# Altium schematic symbol library Analog Devices Data Converters Digital-to-Analog Converters.SchLib: 2231 symbols (part 133 of 135)
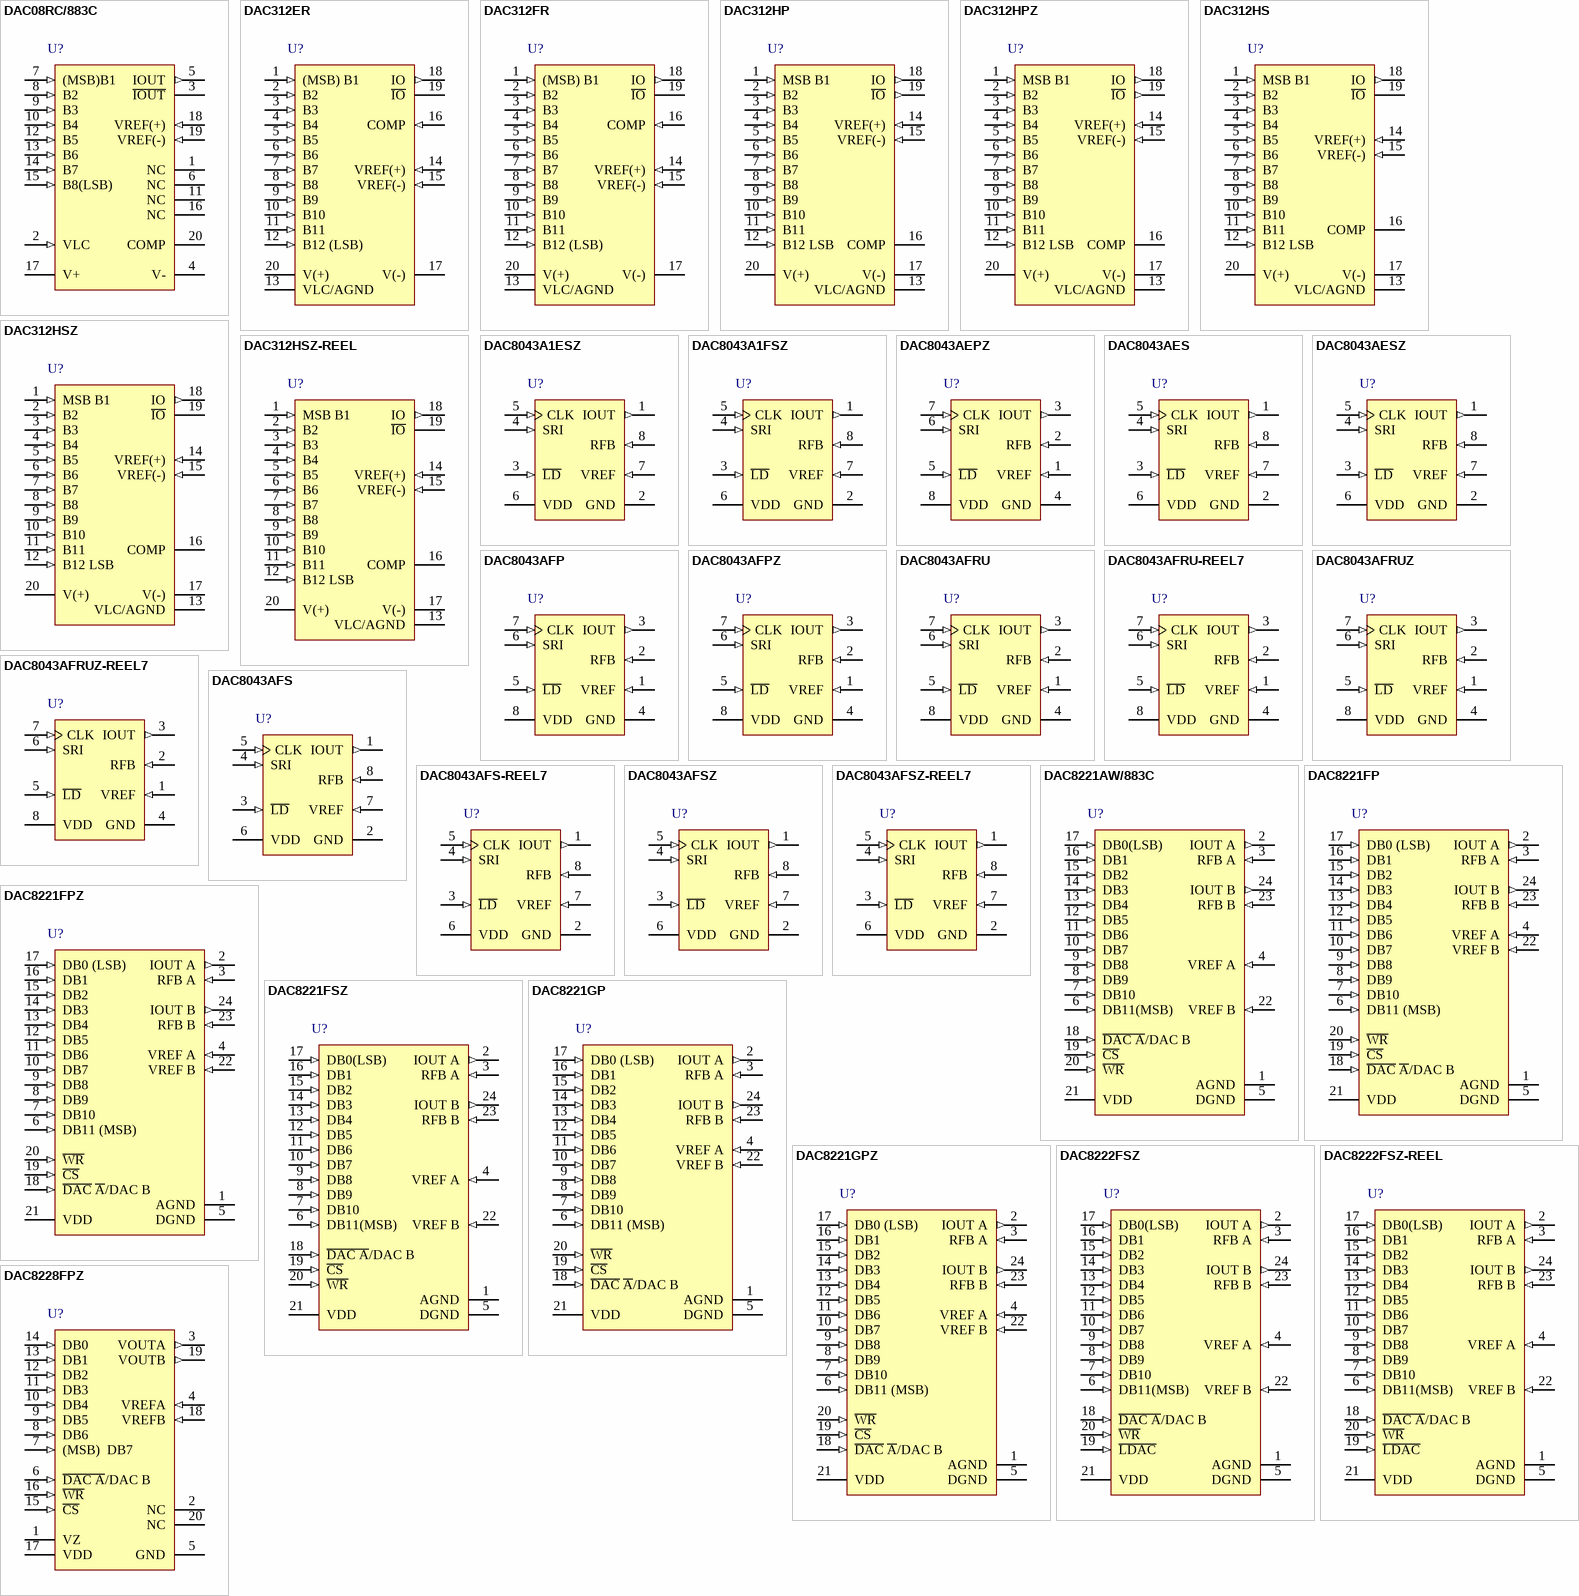
[diagram p245: symbols DAC08RC/883C to DAC8228FPZ]

## DAC8043AFS
designator U?
Single 12-Bit Multiplying Digital-to-Analog Converter with Serial Interface, -40 to +85 degC, R-8, Tube; Generic Part Number: DAC8043A; Manufacturer: Analog Devices; PartNumber: DAC8043AFS; # DAC Outputs: 1; Max V+: 5.5V; Op Pwr Diss: 50µW; Resolution (Bits): 12; Settling Time: 250ns; Single Supply: Yes; DatasheetVersion: Rev.B; PackageVersion: 060506-A; PackageReference: R-8; PackageDescription: 8-Lead Standard Small Outline Package [SOIC_N] Narrow Body; Supplier 1: Digi-Key; Supplier Part Number 1: DAC8043AFS-ND; Supplier 2: Mouser; Supplier Part Number 2: 584-DAC8043AFS; Packing: Tube; RoHS: N; Mounting Technology: Surface Mount; Code_JEDEC: MS-012-AA; Code_IPC: SOIC127P600-8; ComponentLink1Description: Manufacturer URL; ComponentLink1URL: http://www.analog.com/en/index.html; ComponentLink2Description: Datasheet; ComponentLink2URL: http://www.analog.com/static/imported-files/data_sheets/DAC8043A.pdf; ComponentLink3Description: Package Specification; ComponentLink3URL: http://www.analog.com/static/imported-files/packages/PKG_PDF/SOIC_Narrow%20(R)/R_8.pdf; ComponentLink4Description: Product URL; ComponentLink4URL: http://www.analog.com/en/digital-to-analog-converters/da-converters/dac8043a/products/product.html
footprint R-8_N (SOIC, 8-Leads, Body 4.9x3.9mm, Pitch 1.27mm, IPC Medium Density)
footprint R-8_L (SOIC, 8-Leads, Body 4.9x3.9mm, Pitch 1.27mm, IPC High Density)
footprint R-8_M (SOIC, 8-Leads, Body 4.9x3.9mm, Pitch 1.27mm, IPC Low Density)
pins: 1 IOUT (out) "DAC Current Output, full-scale output 1 LSB less than reference input voltage -VREF.", 2 GND (power) "Analog and Digital Ground.", 3 ~{LD} (in) "Load Strobe, Level-Sensitive Digital Input.Transfers shift-register data to DAC register while active low. See truth table for operation.", 4 SRI (in) "12-Bit Serial Register Input, data loads directly into the shift register MSB first. Extra leading bits are ignored.", 5 CLK (in) "Clock Input, positive-edge clocks data into shift register.", 6 VDD (power) "Positive Power Supply Input. Specified range of operation 5V +/- 10%.", 7 VREF (in) "DAC Reference Input Pin. Establishes DAC fullscale voltage. Constant input resistance versus code.", 8 RFB (in) "Internal Matching Feedback Resistor. Connect to external op amp output."

## DAC8043AFS-REEL7
designator U?
Single 12-Bit Multiplying Digital-to-Analog Converter with Serial Interface, -40 to +85 degC, R-8, Reel; Generic Part Number: DAC8043A; Manufacturer: Analog Devices; PartNumber: DAC8043AFS-REEL7; # DAC Outputs: 1; Max V+: 5.5V; Op Pwr Diss: 50µW; Resolution (Bits): 12; Settling Time: 250ns; Single Supply: Yes; DatasheetVersion: Rev.B; PackageVersion: 060506-A; PackageReference: R-8; PackageDescription: 8-Lead Standard Small Outline Package [SOIC_N] Narrow Body; Supplier 1: Digi-Key; Supplier Part Number 1: DAC8043AFS-REEL7-ND; Supplier 2: Mouser; Supplier Part Number 2: 584-DAC8043AFS-R7; Packing: Reel; RoHS: N; Mounting Technology: Surface Mount; Code_JEDEC: MS-012-AA; Code_IPC: SOIC127P600-8; ComponentLink1Description: Manufacturer URL; ComponentLink1URL: http://www.analog.com/en/index.html; ComponentLink2Description: Datasheet; ComponentLink2URL: http://www.analog.com/static/imported-files/data_sheets/DAC8043A.pdf; ComponentLink3Description: Package Specification; ComponentLink3URL: http://www.analog.com/static/imported-files/packages/PKG_PDF/SOIC_Narrow%20(R)/R_8.pdf; ComponentLink4Description: Product URL; ComponentLink4URL: http://www.analog.com/en/digital-to-analog-converters/da-converters/dac8043a/products/product.html
footprint R-8_N (SOIC, 8-Leads, Body 4.9x3.9mm, Pitch 1.27mm, IPC Medium Density)
footprint R-8_L (SOIC, 8-Leads, Body 4.9x3.9mm, Pitch 1.27mm, IPC High Density)
footprint R-8_M (SOIC, 8-Leads, Body 4.9x3.9mm, Pitch 1.27mm, IPC Low Density)
pins: 1 IOUT (out) "DAC Current Output, full-scale output 1 LSB less than reference input voltage -VREF.", 2 GND (power) "Analog and Digital Ground.", 3 ~{LD} (in) "Load Strobe, Level-Sensitive Digital Input.Transfers shift-register data to DAC register while active low. See truth table for operation.", 4 SRI (in) "12-Bit Serial Register Input, data loads directly into the shift register MSB first. Extra leading bits are ignored.", 5 CLK (in) "Clock Input, positive-edge clocks data into shift register.", 6 VDD (power) "Positive Power Supply Input. Specified range of operation 5V +/- 10%.", 7 VREF (in) "DAC Reference Input Pin. Establishes DAC fullscale voltage. Constant input resistance versus code.", 8 RFB (in) "Internal Matching Feedback Resistor. Connect to external op amp output."

## DAC8043AFSZ
designator U?
Single 12-Bit Multiplying Digital-to-Analog Converter with Serial Interface, -40 to +85 degC, R-8, Pb-Free, Tube; Generic Part Number: DAC8043A; Manufacturer: Analog Devices; PartNumber: DAC8043AFSZ; # DAC Outputs: 1; Max V+: 5.5V; Op Pwr Diss: 50µW; Resolution (Bits): 12; Settling Time: 250ns; Single Supply: Yes; DatasheetVersion: Rev.B; PackageVersion: 060506-A; PackageReference: R-8; PackageDescription: 8-Lead Standard Small Outline Package [SOIC_N] Narrow Body; Supplier 1: Digi-Key; Supplier Part Number 1: DAC8043AFSZ-ND; Supplier 2: Newark; Supplier Part Number 2: 59K7916; Supplier 3: Mouser; Supplier Part Number 3: 584-DAC8043AFSZ; Packing: Tube; RoHS: Y; Mounting Technology: Surface Mount; Code_JEDEC: MS-012-AA; Code_IPC: SOIC127P600-8; ComponentLink1Description: Manufacturer URL; ComponentLink1URL: http://www.analog.com/en/index.html; ComponentLink2Description: Datasheet; ComponentLink2URL: http://www.analog.com/static/imported-files/data_sheets/DAC8043A.pdf; ComponentLink3Description: Package Specification; ComponentLink3URL: http://www.analog.com/static/imported-files/packages/PKG_PDF/SOIC_Narrow%20(R)/R_8.pdf; ComponentLink4Description: Product URL; ComponentLink4URL: http://www.analog.com/en/digital-to-analog-converters/da-converters/dac8043a/products/product.html
footprint R-8_N (SOIC, 8-Leads, Body 4.9x3.9mm, Pitch 1.27mm, IPC Medium Density)
footprint R-8_L (SOIC, 8-Leads, Body 4.9x3.9mm, Pitch 1.27mm, IPC High Density)
footprint R-8_M (SOIC, 8-Leads, Body 4.9x3.9mm, Pitch 1.27mm, IPC Low Density)
pins: 1 IOUT (out) "DAC Current Output, full-scale output 1 LSB less than reference input voltage -VREF.", 2 GND (power) "Analog and Digital Ground.", 3 ~{LD} (in) "Load Strobe, Level-Sensitive Digital Input.Transfers shift-register data to DAC register while active low. See truth table for operation.", 4 SRI (in) "12-Bit Serial Register Input, data loads directly into the shift register MSB first. Extra leading bits are ignored.", 5 CLK (in) "Clock Input, positive-edge clocks data into shift register.", 6 VDD (power) "Positive Power Supply Input. Specified range of operation 5V +/- 10%.", 7 VREF (in) "DAC Reference Input Pin. Establishes DAC fullscale voltage. Constant input resistance versus code.", 8 RFB (in) "Internal Matching Feedback Resistor. Connect to external op amp output."

## DAC8043AFSZ-REEL7
designator U?
Single 12-Bit Multiplying Digital-to-Analog Converter with Serial Interface, -40 to +85 degC, R-8, Pb-Free, Reel; Generic Part Number: DAC8043A; Manufacturer: Analog Devices; PartNumber: DAC8043AFSZ-REEL7; # DAC Outputs: 1; Max V+: 5.5V; Op Pwr Diss: 50µW; Resolution (Bits): 12; Settling Time: 250ns; Single Supply: Yes; DatasheetVersion: Rev.B; PackageVersion: 060506-A; PackageReference: R-8; PackageDescription: 8-Lead Standard Small Outline Package [SOIC_N] Narrow Body; Supplier 1: Digi-Key; Supplier Part Number 1: DAC8043AFSZ-REEL7-ND; Supplier 2: Newark; Supplier Part Number 2: 59K7917; Supplier 3: Mouser; Supplier Part Number 3: 584-DAC8043AFSZR7; Packing: Reel; RoHS: Y; Mounting Technology: Surface Mount; Code_JEDEC: MS-012-AA; Code_IPC: SOIC127P600-8; ComponentLink1Description: Manufacturer URL; ComponentLink1URL: http://www.analog.com/en/index.html; ComponentLink2Description: Datasheet; ComponentLink2URL: http://www.analog.com/static/imported-files/data_sheets/DAC8043A.pdf; ComponentLink3Description: Package Specification; ComponentLink3URL: http://www.analog.com/static/imported-files/packages/PKG_PDF/SOIC_Narrow%20(R)/R_8.pdf; ComponentLink4Description: Product URL; ComponentLink4URL: http://www.analog.com/en/digital-to-analog-converters/da-converters/dac8043a/products/product.html
footprint R-8_N (SOIC, 8-Leads, Body 4.9x3.9mm, Pitch 1.27mm, IPC Medium Density)
footprint R-8_L (SOIC, 8-Leads, Body 4.9x3.9mm, Pitch 1.27mm, IPC High Density)
footprint R-8_M (SOIC, 8-Leads, Body 4.9x3.9mm, Pitch 1.27mm, IPC Low Density)
pins: 1 IOUT (out) "DAC Current Output, full-scale output 1 LSB less than reference input voltage -VREF.", 2 GND (power) "Analog and Digital Ground.", 3 ~{LD} (in) "Load Strobe, Level-Sensitive Digital Input.Transfers shift-register data to DAC register while active low. See truth table for operation.", 4 SRI (in) "12-Bit Serial Register Input, data loads directly into the shift register MSB first. Extra leading bits are ignored.", 5 CLK (in) "Clock Input, positive-edge clocks data into shift register.", 6 VDD (power) "Positive Power Supply Input. Specified range of operation 5V +/- 10%.", 7 VREF (in) "DAC Reference Input Pin. Establishes DAC fullscale voltage. Constant input resistance versus code.", 8 RFB (in) "Internal Matching Feedback Resistor. Connect to external op amp output."

## DAC8221AW/883C
designator U?
Dual 12-Bit CMOS Buffered Multiplying Digital-to-Analog Converter, -55 to +125 degC, Q-24-1, Tube; Generic Part Number: DAC8221; Manufacturer: Analog Devices; PartNumber: DAC8221AW/883C; # DAC Outputs: 2; Max V+: 15.75V; Op Pwr Diss: 5mW; Resolution (Bits): 12; Settling Time: 450ns; Single Supply: Yes; DatasheetVersion: Rev.B; PackageVersion: 100808-A; PackageReference: Q-24-1; PackageDescription: 24-Lead Ceramic Dual In-Line Package [CERDIP]; Supplier 1: Mouser; Supplier Part Number 1: 584-DAC8221AW883C; Packing: Tube; RoHS: N; Mounting Technology: Through Hole; ComponentLink1Description: Manufacturer URL; ComponentLink1URL: http://www.analog.com/en/index.html; ComponentLink2Description: Datasheet; ComponentLink2URL: http://www.analog.com/static/imported-files/data_sheets/DAC8221.pdf; ComponentLink3Description: Package Specification; ComponentLink3URL: http://www.analog.com/static/imported-files/packages/PKG_PDF/CERDIP(Q)/Q_24_1.pdf; ComponentLink4Description: Product URL; ComponentLink4URL: http://www.analog.com/en/digital-to-analog-converters/da-converters/dac8221/products/product.html
footprint Q-24-1 (DIP, 24-Leads, Row Spacing 7.62mm, Pitch 2.54mm, Body 31.9x6.7mm)
pins: 1 AGND (power), 2 IOUT A (out), 3 RFB A (in), 4 VREF A (in), 5 DGND (power), 6 DB11(MSB)  (in), 7 DB10 (in), 8 DB9 (in), 9 DB8 (in), 10 DB7 (in), 11 DB6 (in), 12 DB5 (in), 13 DB4 (in), 14 DB3 (in), 15 DB2 (in), 16 DB1 (in), 17 DB0(LSB) (in), 18 ~{DAC A}/DAC B (in), 19 ~{CS} (in), 20 ~{WR} (in), 21 VDD (power), 22 VREF B (in), 23 RFB B (in), 24 IOUT B (out)

## DAC8221FP
designator U?
Dual 12-Bit CMOS Buffered Multiplying Digital-to-Analog Converter, -40 to +85 degC, N-24-1, Tube; Generic Part Number: DAC8221; Manufacturer: Analog Devices; PartNumber: DAC8221FP; # DAC Outputs: 2; Max V+: 15.75V; Op Pwr Diss: 5mW; Resolution (Bits): 12; Settling Time: 450ns; Single Supply: Yes; DatasheetVersion: Rev.B; PackageVersion: 071006-A; PackageReference: N-24-1; PackageDescription: 24-Lead Plastic Dual In-Line Package [PDIP] Narrow Body; Supplier 1: Digi-Key; Supplier Part Number 1: DAC8221FP-ND; Supplier 2: Mouser; Supplier Part Number 2: 584-DAC8221FP; Packing: Tube; RoHS: N; Mounting Technology: Through Hole; Code_JEDEC: MS-001; ComponentLink1Description: Manufacturer URL; ComponentLink1URL: http://www.analog.com/en/index.html; ComponentLink2Description: Datasheet; ComponentLink2URL: http://www.analog.com/static/imported-files/data_sheets/DAC8221.pdf; ComponentLink3Description: Package Specification; ComponentLink3URL: http://www.analog.com/static/imported-files/packages/50726455539629N_24_1.pdf; ComponentLink4Description: Product URL; ComponentLink4URL: http://www.analog.com/en/digital-to-analog-converters/da-converters/dac8221/products/product.html
footprint N-24-1 (DIP, 24-Leads, Row Spacing 7.62mm, Pitch 2.54mm, Body 31.9x6.6mm)
pins: 1 AGND (power), 2 IOUT A (out), 3 RFB A (in), 4 VREF A (in), 5 DGND (power), 6 DB11 (MSB) (in), 7 DB10 (in), 8 DB9 (in), 9 DB8 (in), 10 DB7 (in), 11 DB6 (in), 12 DB5 (in), 13 DB4 (in), 14 DB3 (in), 15 DB2 (in), 16 DB1 (in), 17 DB0 (LSB) (in), 18 ~{DAC} ~{A}/DAC B (in), 19 ~{CS} (in), 20 ~{WR} (in), 21 VDD (power), 22 VREF B (in), 23 RFB B (in), 24 IOUT B (out)

## DAC8221FPZ
designator U?
Dual 12-Bit CMOS Buffered Multiplying Digital-to-Analog Converter, -40 to +85 degC, N-24-1, Pb-Free, Tube; Generic Part Number: DAC8221; Manufacturer: Analog Devices; PartNumber: DAC8221FPZ; # DAC Outputs: 2; Max V+: 15.75V; Op Pwr Diss: 5mW; Resolution (Bits): 12; Settling Time: 450ns; Single Supply: Yes; DatasheetVersion: Rev.B; PackageVersion: 071006-A; PackageReference: N-24-1; PackageDescription: 24-Lead Plastic Dual In-Line Package [PDIP] Narrow Body; Supplier 1: Digi-Key; Supplier Part Number 1: DAC8221FPZ-ND; Supplier 2: Mouser; Supplier Part Number 2: 584-DAC8221FPZ; Packing: Tube; RoHS: Y; Mounting Technology: Through Hole; Code_JEDEC: MS-001; ComponentLink1Description: Manufacturer URL; ComponentLink1URL: http://www.analog.com/en/index.html; ComponentLink2Description: Datasheet; ComponentLink2URL: http://www.analog.com/static/imported-files/data_sheets/DAC8221.pdf; ComponentLink3Description: Package Specification; ComponentLink3URL: http://www.analog.com/static/imported-files/packages/50726455539629N_24_1.pdf; ComponentLink4Description: Product URL; ComponentLink4URL: http://www.analog.com/en/digital-to-analog-converters/da-converters/dac8221/products/product.html
footprint N-24-1 (DIP, 24-Leads, Row Spacing 7.62mm, Pitch 2.54mm, Body 31.9x6.6mm)
pins: 1 AGND (power), 2 IOUT A (out), 3 RFB A (in), 4 VREF A (in), 5 DGND (power), 6 DB11 (MSB) (in), 7 DB10 (in), 8 DB9 (in), 9 DB8 (in), 10 DB7 (in), 11 DB6 (in), 12 DB5 (in), 13 DB4 (in), 14 DB3 (in), 15 DB2 (in), 16 DB1 (in), 17 DB0 (LSB) (in), 18 ~{DAC} ~{A}/DAC B (in), 19 ~{CS} (in), 20 ~{WR} (in), 21 VDD (power), 22 VREF B (in), 23 RFB B (in), 24 IOUT B (out)

## DAC8221FSZ
designator U?
Dual 12-Bit CMOS Buffered Multiplying Digital-to-Analog Converter, -40 to +85 degC, RW-24, Pb-Free, Tube; Generic Part Number: DAC8221; Manufacturer: Analog Devices; PartNumber: DAC8221FSZ; # DAC Outputs: 2; Max V+: 15.75V; Op Pwr Diss: 5mW; Resolution (Bits): 12; Settling Time: 450ns; Single Supply: Yes; DatasheetVersion: Rev.B; PackageVersion: 060706-A; PackageReference: RW-24; PackageDescription: 24-Lead Standard Small Outline Package [SOIC_W]; Supplier 1: Digi-Key; Supplier Part Number 1: DAC8221FSZ-ND; Supplier 2: Mouser; Supplier Part Number 2: 584-DAC8221FSZ; Packing: Tube; RoHS: Y; Mounting Technology: Surface Mount; Code_JEDEC: MS-013-AD; ComponentLink1Description: Manufacturer URL; ComponentLink1URL: http://www.analog.com/en/index.html; ComponentLink2Description: Datasheet; ComponentLink2URL: http://www.analog.com/static/imported-files/data_sheets/DAC8221.pdf; ComponentLink3Description: Package Specification; ComponentLink3URL: http://www.analog.com/static/imported-files/packages/33665150946139RW_24.pdf; ComponentLink4Description: Product URL; ComponentLink4URL: http://www.analog.com/en/digital-to-analog-converters/da-converters/dac8221/products/product.html
footprint RW-24_N (SOIC, 24-Leads, Body 15.4x7.5mm, Pitch 1.27mm, IPC Medium Density)
footprint RW-24_L (SOIC, 24-Leads, Body 15.4x7.5mm, Pitch 1.27mm, IPC High Density)
footprint RW-24_M (SOIC, 24-Leads, Body 15.4x7.5mm, Pitch 1.27mm, IPC Low Density)
pins: 1 AGND (power), 2 IOUT A (out), 3 RFB A (in), 4 VREF A (in), 5 DGND (power), 6 DB11(MSB) (in), 7 DB10 (in), 8 DB9 (in), 9 DB8 (in), 10 DB7 (in), 11 DB6 (in), 12 DB5 (in), 13 DB4 (in), 14 DB3 (in), 15 DB2 (in), 16 DB1 (in), 17 DB0(LSB) (in), 18 ~{DAC A}/DAC B (in), 19 ~{CS} (in), 20 ~{WR} (in), 21 VDD (power), 22 VREF B (in), 23 RFB B (in), 24 IOUT B (out)

## DAC8221GP
designator U?
Dual 12-Bit CMOS Buffered Multiplying Digital-to-Analog Converter, 0 to +70 degC, N-24-1, Tube; Generic Part Number: DAC8221; Manufacturer: Analog Devices; PartNumber: DAC8221GP; # DAC Outputs: 2; Max V+: 15.75V; Op Pwr Diss: 5mW; Resolution (Bits): 12; Settling Time: 450ns; Single Supply: Yes; DatasheetVersion: Rev.B; PackageVersion: 071006-A; PackageReference: N-24-1; PackageDescription: 24-Lead Plastic Dual In-Line Package [PDIP] Narrow Body; Supplier 1: Digi-Key; Supplier Part Number 1: DAC8221GP-ND; Supplier 2: Mouser; Supplier Part Number 2: 584-DAC8221GP; Packing: Tube; RoHS: N; Mounting Technology: Through Hole; Code_JEDEC: MS-001; ComponentLink1Description: Manufacturer URL; ComponentLink1URL: http://www.analog.com/en/index.html; ComponentLink2Description: Datasheet; ComponentLink2URL: http://www.analog.com/static/imported-files/data_sheets/DAC8221.pdf; ComponentLink3Description: Package Specification; ComponentLink3URL: http://www.analog.com/static/imported-files/packages/50726455539629N_24_1.pdf; ComponentLink4Description: Product URL; ComponentLink4URL: http://www.analog.com/en/digital-to-analog-converters/da-converters/dac8221/products/product.html
footprint N-24-1 (DIP, 24-Leads, Row Spacing 7.62mm, Pitch 2.54mm, Body 31.9x6.6mm)
pins: 1 AGND (power), 2 IOUT A (out), 3 RFB A (in), 4 VREF A (in), 5 DGND (power), 6 DB11 (MSB) (in), 7 DB10 (in), 8 DB9 (in), 9 DB8 (in), 10 DB7 (in), 11 DB6 (in), 12 DB5 (in), 13 DB4 (in), 14 DB3 (in), 15 DB2 (in), 16 DB1 (in), 17 DB0 (LSB) (in), 18 ~{DAC} ~{A}/DAC B (in), 19 ~{CS} (in), 20 ~{WR} (in), 21 VDD (power), 22 VREF B (in), 23 RFB B (in), 24 IOUT B (out)

## DAC8221GPZ
designator U?
Dual 12-Bit CMOS Buffered Multiplying Digital-to-Analog Converter, 0 to +70 degC, N-24-1, Pb-Free, Tube; Generic Part Number: DAC8221; Manufacturer: Analog Devices; PartNumber: DAC8221GPZ; # DAC Outputs: 2; Max V+: 15.75V; Op Pwr Diss: 5mW; Resolution (Bits): 12; Settling Time: 450ns; Single Supply: Yes; DatasheetVersion: Rev.B; PackageVersion: 071006-A; PackageReference: N-24-1; PackageDescription: 24-Lead Plastic Dual In-Line Package [PDIP] Narrow Body; Supplier 1: Digi-Key; Supplier Part Number 1: DAC8221GPZ-ND; Supplier 2: Mouser; Supplier Part Number 2: 584-DAC8221GPZ; Packing: Tube; RoHS: Y; Mounting Technology: Through Hole; Code_JEDEC: MS-001; ComponentLink1Description: Manufacturer URL; ComponentLink1URL: http://www.analog.com/en/index.html; ComponentLink2Description: Datasheet; ComponentLink2URL: http://www.analog.com/static/imported-files/data_sheets/DAC8221.pdf; ComponentLink3Description: Package Specification; ComponentLink3URL: http://www.analog.com/static/imported-files/packages/50726455539629N_24_1.pdf; ComponentLink4Description: Product URL; ComponentLink4URL: http://www.analog.com/en/digital-to-analog-converters/da-converters/dac8221/products/product.html
footprint N-24-1 (DIP, 24-Leads, Row Spacing 7.62mm, Pitch 2.54mm, Body 31.9x6.6mm)
pins: 1 AGND (power), 2 IOUT A (out), 3 RFB A (in), 4 VREF A (in), 5 DGND (power), 6 DB11 (MSB) (in), 7 DB10 (in), 8 DB9 (in), 9 DB8 (in), 10 DB7 (in), 11 DB6 (in), 12 DB5 (in), 13 DB4 (in), 14 DB3 (in), 15 DB2 (in), 16 DB1 (in), 17 DB0 (LSB) (in), 18 ~{DAC} ~{A}/DAC B (in), 19 ~{CS} (in), 20 ~{WR} (in), 21 VDD (power), 22 VREF B (in), 23 RFB B (in), 24 IOUT B (out)

## DAC8222FSZ
designator U?
Dual 12-Bit CMOS Buffered Multiplying Digital-to-Analog Converter, -40 to +85 degC, RW-24, Pb-Free, Tube; Generic Part Number: DAC8222; Manufacturer: Analog Devices; PartNumber: DAC8222FSZ; # DAC Outputs: 2; Max V+: 15.75V; Op Pwr Diss: 50µW; Resolution (Bits): 12; Settling Time: 1µs; Single Supply: Yes; DatasheetVersion: Rev.C; PackageVersion: 060706-A; PackageReference: RW-24; PackageDescription: 24-Lead Standard Small Outline Package [SOIC_W]; Supplier 1: Digi-Key; Supplier Part Number 1: DAC8222FSZ-ND; Supplier 2: Farnell; Supplier Part Number 2: 1438738; Supplier 3: Newark; Supplier Part Number 3: 59K7927; Supplier 4: Mouser; Supplier Part Number 4: 584-DAC8222FSZ; Packing: Tube; RoHS: Y; Mounting Technology: Surface Mount; Code_JEDEC: MS-013-AD; ComponentLink1Description: Manufacturer URL; ComponentLink1URL: http://www.analog.com/en/index.html; ComponentLink2Description: Datasheet; ComponentLink2URL: http://www.analog.com/static/imported-files/data_sheets/DAC8222.pdf; ComponentLink3Description: Package Specification; ComponentLink3URL: http://www.analog.com/static/imported-files/packages/33665150946139RW_24.pdf; ComponentLink4Description: Product URL; ComponentLink4URL: http://www.analog.com/en/digital-to-analog-converters/da-converters/dac8222/products/product.html
footprint RW-24_N (SOIC, 24-Leads, Body 15.4x7.5mm, Pitch 1.27mm, IPC Medium Density)
footprint RW-24_L (SOIC, 24-Leads, Body 15.4x7.5mm, Pitch 1.27mm, IPC High Density)
footprint RW-24_M (SOIC, 24-Leads, Body 15.4x7.5mm, Pitch 1.27mm, IPC Low Density)
pins: 1 AGND (power), 2 IOUT A (out), 3 RFB A (in), 4 VREF A (in), 5 DGND (power), 6 DB11(MSB) (in), 7 DB10 (in), 8 DB9 (in), 9 DB8 (in), 10 DB7 (in), 11 DB6 (in), 12 DB5 (in), 13 DB4 (in), 14 DB3 (in), 15 DB2 (in), 16 DB1 (in), 17 DB0(LSB) (in), 18 ~{DAC A}/DAC B (in), 19 ~{LDAC} (in), 20 ~{WR} (in), 21 VDD (power), 22 VREF B (in), 23 RFB B (in), 24 IOUT B (out)

## DAC8222FSZ-REEL
designator U?
Dual 12-Bit CMOS Buffered Multiplying Digital-to-Analog Converter, 0 to +70 degC, RW-24, Pb-Free, Reel; Generic Part Number: DAC8222; Manufacturer: Analog Devices; PartNumber: DAC8222FSZ-REEL; # DAC Outputs: 2; Max V+: 15.75V; Op Pwr Diss: 50µW; Resolution (Bits): 12; Settling Time: 1µs; Single Supply: Yes; DatasheetVersion: Rev.C; PackageVersion: 060706-A; PackageReference: RW-24; PackageDescription: 24-Lead Standard Small Outline Package [SOIC_W]; Supplier 1: Digi-Key; Supplier Part Number 1: DAC8222FSZ-REEL-ND; Supplier 2: Newark; Supplier Part Number 2: 52R8312; Supplier 3: Mouser; Supplier Part Number 3: 584-DAC8222FSZ-R; Packing: Reel; RoHS: Y; Mounting Technology: Surface Mount; Code_JEDEC: MS-013-AD; ComponentLink1Description: Manufacturer URL; ComponentLink1URL: http://www.analog.com/en/index.html; ComponentLink2Description: Datasheet; ComponentLink2URL: http://www.analog.com/static/imported-files/data_sheets/DAC8222.pdf; ComponentLink3Description: Package Specification; ComponentLink3URL: http://www.analog.com/static/imported-files/packages/33665150946139RW_24.pdf; ComponentLink4Description: Product URL; ComponentLink4URL: http://www.analog.com/en/digital-to-analog-converters/da-converters/dac8222/products/product.html
footprint RW-24_N (SOIC, 24-Leads, Body 15.4x7.5mm, Pitch 1.27mm, IPC Medium Density)
footprint RW-24_L (SOIC, 24-Leads, Body 15.4x7.5mm, Pitch 1.27mm, IPC High Density)
footprint RW-24_M (SOIC, 24-Leads, Body 15.4x7.5mm, Pitch 1.27mm, IPC Low Density)
pins: 1 AGND (power), 2 IOUT A (out), 3 RFB A (in), 4 VREF A (in), 5 DGND (power), 6 DB11(MSB) (in), 7 DB10 (in), 8 DB9 (in), 9 DB8 (in), 10 DB7 (in), 11 DB6 (in), 12 DB5 (in), 13 DB4 (in), 14 DB3 (in), 15 DB2 (in), 16 DB1 (in), 17 DB0(LSB) (in), 18 ~{DAC A}/DAC B (in), 19 ~{LDAC} (in), 20 ~{WR} (in), 21 VDD (power), 22 VREF B (in), 23 RFB B (in), 24 IOUT B (out)

## DAC8228FPZ
designator U?
Dual 8-Bit CMOS Voltage Output Digital-to-Analog Converter, -40 to +85 degC, N-20, Pb-Free, Tube; Generic Part Number: DAC8228; Manufacturer: Analog Devices; PartNumber: DAC8228FPZ; # DAC Outputs: 2; Max V+: 15.75V; Op Pwr Diss: 84mW; Resolution (Bits): 8; Settling Time: 2µs; Single Supply: Yes; DatasheetVersion: Rev.A; PackageVersion: 070706-A; PackageReference: N-20; PackageDescription: 20-Lead Plastic Dual In-Line Package [PDIP] Narrow Body; Supplier 1: Digi-Key; Supplier Part Number 1: DAC8228FPZ-ND; Supplier 2: Farnell; Supplier Part Number 2: 1079367; Supplier 3: Newark; Supplier Part Number 3: 31M4868; Supplier 4: Mouser; Supplier Part Number 4: 584-DAC8228FPZ; Packing: Tube; RoHS: Y; Mounting Technology: Through Hole; Code_JEDEC: MS-001; ComponentLink1Description: Manufacturer URL; ComponentLink1URL: http://www.analog.com/en/index.html; ComponentLink2Description: Datasheet; ComponentLink2URL: http://www.analog.com/static/imported-files/data_sheets/DAC8228.pdf; ComponentLink3Description: Package Specification; ComponentLink3URL: http://www.analog.com/static/imported-files/packages/50601349676519N_20.pdf; ComponentLink4Description: Product URL; ComponentLink4URL: http://www.analog.com/en/digital-to-analog-converters/da-converters/dac8228/products/product.html
footprint N-20 (DIP, 20-Leads, Row Spacing 7.62mm, Pitch 2.54mm, Body 25.9x6.6mm)
pins: 1 VZ (power), 2 NC, 3 VOUTA (out), 4 VREFA (in), 5 GND (power), 6 ~{DAC A}/DAC B (in), 7 (MSB)  DB7 (in), 8 DB6 (in), 9 DB5 (in), 10 DB4 (in), 11 DB3 (in), 12 DB2 (in), 13 DB1 (in), 14 DB0 (in), 15 ~{CS} (in), 16 ~{WR} (in), 17 VDD (power), 18 VREFB (in), 19 VOUTB (out), 20 NC

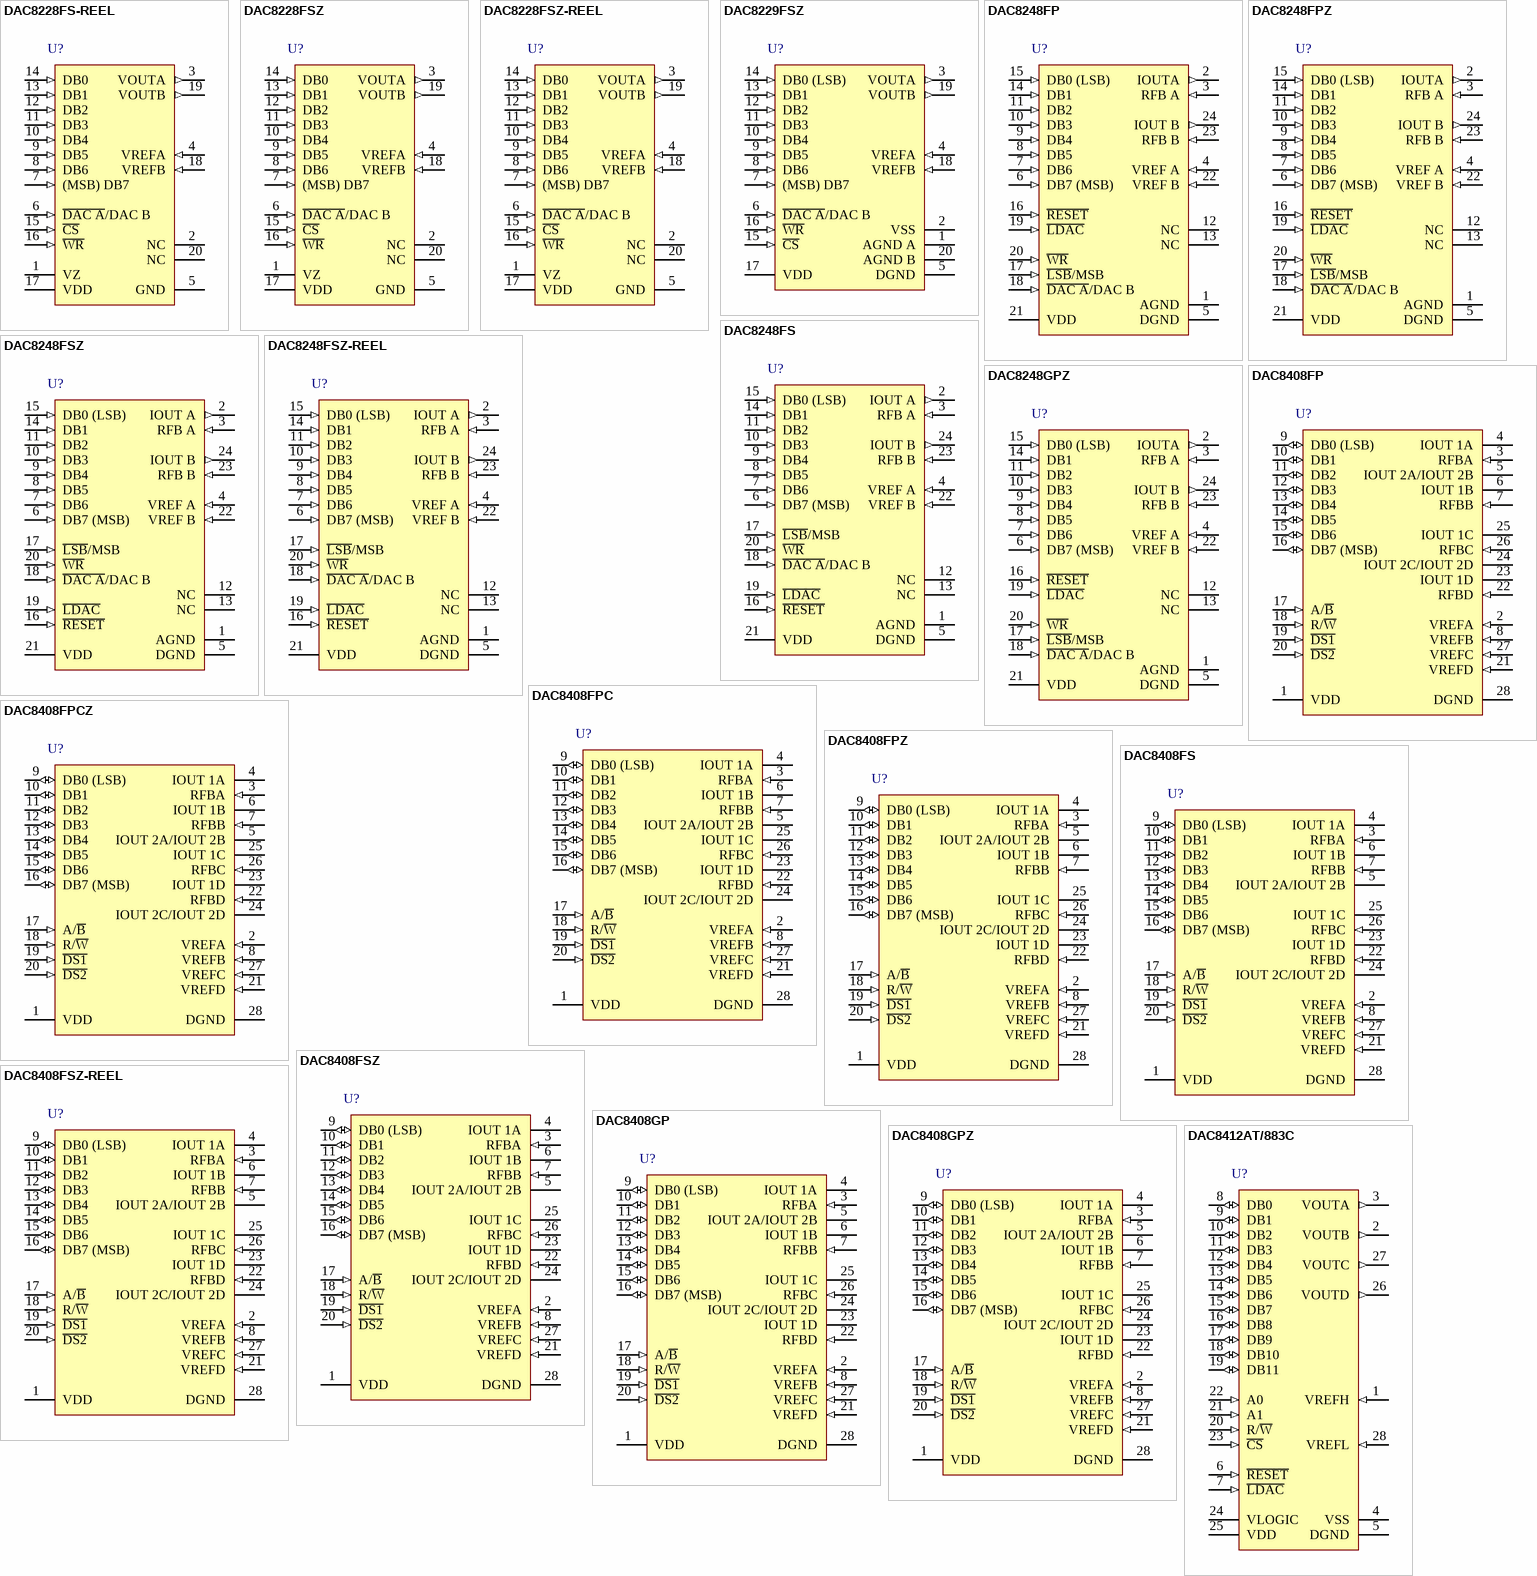
[diagram p111: symbols DAC8228FS-REEL to DAC8412AT/883C]

## DAC8228FS-REEL
designator U?
Dual 8-Bit CMOS Voltage Output Digital-to-Analog Converter, 0 to +70 degC, RW-20, Reel; Generic Part Number: DAC8228; Manufacturer: Analog Devices; PartNumber: DAC8228FS-REEL; # DAC Outputs: 2; Max V+: 15.75V; Op Pwr Diss: 84mW; Resolution (Bits): 8; Settling Time: 2µs; Single Supply: Yes; DatasheetVersion: Rev.A; PackageVersion: 060706-A; PackageReference: RW-20; PackageDescription: 20-Lead Standard Small Outline Package [SOIC_W] Wide Body; Supplier 1: Digi-Key; Supplier Part Number 1: DAC8228FS-REELTR-ND; Supplier 2: Digi-Key; Supplier Part Number 2: DAC8228FS-REELCT-ND; Supplier 3: Digi-Key; Supplier Part Number 3: DAC8228FS-REELDKR-ND; Supplier 4: Mouser; Supplier Part Number 4: 584-DAC8228FS-R; Packing: Reel; RoHS: N; Mounting Technology: Surface Mount; Code_JEDEC: MS-013-AC; ComponentLink1Description: Manufacturer URL; ComponentLink1URL: http://www.analog.com/en/index.html; ComponentLink2Description: Datasheet; ComponentLink2URL: http://www.analog.com/static/imported-files/data_sheets/DAC8228.pdf; ComponentLink3Description: Package Specification; ComponentLink3URL: http://www.analog.com/static/imported-files/packages/233848RW_20.pdf; ComponentLink4Description: Product URL; ComponentLink4URL: http://www.analog.com/en/digital-to-analog-converters/da-converters/dac8228/products/product.html
footprint RW-20_N (SOIC, 20-Leads, Body 12.8x7.5mm, Pitch 1.27mm, IPC Medium Density)
footprint RW-20_L (SOIC, 20-Leads, Body 12.8x7.5mm, Pitch 1.27mm, IPC High Density)
footprint RW-20_M (SOIC, 20-Leads, Body 12.8x7.5mm, Pitch 1.27mm, IPC Low Density)
pins: 1 VZ (power), 2 NC, 3 VOUTA (out), 4 VREFA (in), 5 GND (power), 6 ~{DAC A}/DAC B (in), 7 (MSB) DB7 (in), 8 DB6 (in), 9 DB5 (in), 10 DB4 (in), 11 DB3 (in), 12 DB2 (in), 13 DB1 (in), 14 DB0 (in), 15 ~{CS} (in), 16 ~{WR} (in), 17 VDD (power), 18 VREFB (in), 19 VOUTB (out), 20 NC

## DAC8228FSZ
designator U?
Dual 8-Bit CMOS Voltage Output Digital-to-Analog Converter, -40 to +85 degC, RW-20, Pb-Free, Tube; Generic Part Number: DAC8228; Manufacturer: Analog Devices; PartNumber: DAC8228FSZ; # DAC Outputs: 2; Max V+: 15.75V; Op Pwr Diss: 84mW; Resolution (Bits): 8; Settling Time: 2µs; Single Supply: Yes; DatasheetVersion: Rev.A; PackageVersion: 060706-A; PackageReference: RW-20; PackageDescription: 20-Lead Standard Small Outline Package [SOIC_W] Wide Body; Supplier 1: Digi-Key; Supplier Part Number 1: DAC8228FSZ-ND; Supplier 2: Mouser; Supplier Part Number 2: 584-DAC8228FSZ; Packing: Tube; RoHS: Y; Mounting Technology: Surface Mount; Code_JEDEC: MS-013-AC; ComponentLink1Description: Manufacturer URL; ComponentLink1URL: http://www.analog.com/en/index.html; ComponentLink2Description: Datasheet; ComponentLink2URL: http://www.analog.com/static/imported-files/data_sheets/DAC8228.pdf; ComponentLink3Description: Package Specification; ComponentLink3URL: http://www.analog.com/static/imported-files/packages/233848RW_20.pdf; ComponentLink4Description: Product URL; ComponentLink4URL: http://www.analog.com/en/digital-to-analog-converters/da-converters/dac8228/products/product.html
footprint RW-20_N (SOIC, 20-Leads, Body 12.8x7.5mm, Pitch 1.27mm, IPC Medium Density)
footprint RW-20_L (SOIC, 20-Leads, Body 12.8x7.5mm, Pitch 1.27mm, IPC High Density)
footprint RW-20_M (SOIC, 20-Leads, Body 12.8x7.5mm, Pitch 1.27mm, IPC Low Density)
pins: 1 VZ (power), 2 NC, 3 VOUTA (out), 4 VREFA (in), 5 GND (power), 6 ~{DAC A}/DAC B (in), 7 (MSB) DB7 (in), 8 DB6 (in), 9 DB5 (in), 10 DB4 (in), 11 DB3 (in), 12 DB2 (in), 13 DB1 (in), 14 DB0 (in), 15 ~{CS} (in), 16 ~{WR} (in), 17 VDD (power), 18 VREFB (in), 19 VOUTB (out), 20 NC

## DAC8228FSZ-REEL
designator U?
Dual 8-Bit CMOS Voltage Output Digital-to-Analog Converter, 0 to +70 degC, RW-20, Pb-Free, Reel; Generic Part Number: DAC8228; Manufacturer: Analog Devices; PartNumber: DAC8228FSZ-REEL; # DAC Outputs: 2; Max V+: 15.75V; Op Pwr Diss: 84mW; Resolution (Bits): 8; Settling Time: 2µs; Single Supply: Yes; DatasheetVersion: Rev.A; PackageVersion: 060706-A; PackageReference: RW-20; PackageDescription: 20-Lead Standard Small Outline Package [SOIC_W] Wide Body; Supplier 1: Digi-Key; Supplier Part Number 1: DAC8228FSZ-REEL-ND; Supplier 2: Mouser; Supplier Part Number 2: 584-DAC8228FSZ-R; Packing: Reel; RoHS: Y; Mounting Technology: Surface Mount; Code_JEDEC: MS-013-AC; ComponentLink1Description: Manufacturer URL; ComponentLink1URL: http://www.analog.com/en/index.html; ComponentLink2Description: Datasheet; ComponentLink2URL: http://www.analog.com/static/imported-files/data_sheets/DAC8228.pdf; ComponentLink3Description: Package Specification; ComponentLink3URL: http://www.analog.com/static/imported-files/packages/233848RW_20.pdf; ComponentLink4Description: Product URL; ComponentLink4URL: http://www.analog.com/en/digital-to-analog-converters/da-converters/dac8228/products/product.html
footprint RW-20_N (SOIC, 20-Leads, Body 12.8x7.5mm, Pitch 1.27mm, IPC Medium Density)
footprint RW-20_L (SOIC, 20-Leads, Body 12.8x7.5mm, Pitch 1.27mm, IPC High Density)
footprint RW-20_M (SOIC, 20-Leads, Body 12.8x7.5mm, Pitch 1.27mm, IPC Low Density)
pins: 1 VZ (power), 2 NC, 3 VOUTA (out), 4 VREFA (in), 5 GND (power), 6 ~{DAC A}/DAC B (in), 7 (MSB) DB7 (in), 8 DB6 (in), 9 DB5 (in), 10 DB4 (in), 11 DB3 (in), 12 DB2 (in), 13 DB1 (in), 14 DB0 (in), 15 ~{CS} (in), 16 ~{WR} (in), 17 VDD (power), 18 VREFB (in), 19 VOUTB (out), 20 NC

## DAC8229FSZ
designator U?
Dual 8-Bit CMOS Voltage Output Digital-to-Analog Converter, -40 to +85 degC, RW-20, Pb-Free, Tube; Generic Part Number: DAC8229; Manufacturer: Analog Devices; PartNumber: DAC8229FSZ; # DAC Outputs: 2; Max V+: 15.75V; Op Pwr Diss: 97mW; Resolution (Bits): 8; Settling Time: 2µs; Single Supply: No; DatasheetVersion: Rev.A; PackageVersion: 060706-A; PackageReference: RW-20; PackageDescription: 20-Lead Standard Small Outline Package [SOIC_W] Wide Body; Supplier 1: Digi-Key; Supplier Part Number 1: DAC8229FSZ-ND; Supplier 2: Farnell; Supplier Part Number 2: 2312727; Supplier 3: Newark; Supplier Part Number 3: 12M9665; Supplier 4: Mouser; Supplier Part Number 4: 584-DAC8229FSZ; Packing: Tube; RoHS: Y; Mounting Technology: Surface Mount; Code_JEDEC: MS-013-AC; ComponentLink1Description: Manufacturer URL; ComponentLink1URL: http://www.analog.com/en/index.html; ComponentLink2Description: Datasheet; ComponentLink2URL: http://www.analog.com/static/imported-files/data_sheets/DAC8229.pdf; ComponentLink3Description: Package Specification; ComponentLink3URL: http://www.analog.com/static/imported-files/packages/233848RW_20.pdf; ComponentLink4Description: Product URL; ComponentLink4URL: http://www.analog.com/en/digital-to-analog-converters/da-converters/dac8229/products/product.html
footprint RW-20_N (SOIC, 20-Leads, Body 12.8x7.5mm, Pitch 1.27mm, IPC Medium Density)
footprint RW-20_L (SOIC, 20-Leads, Body 12.8x7.5mm, Pitch 1.27mm, IPC High Density)
footprint RW-20_M (SOIC, 20-Leads, Body 12.8x7.5mm, Pitch 1.27mm, IPC Low Density)
pins: 1 AGND A (power), 2 VSS (power), 3 VOUTA (out), 4 VREFA (in), 5 DGND (power), 6 ~{DAC A}/DAC B (in), 7 (MSB) DB7 (in), 8 DB6 (in), 9 DB5 (in), 10 DB4 (in), 11 DB3 (in), 12 DB2 (in), 13 DB1 (in), 14 DB0 (LSB) (in), 15 ~{CS} (in), 16 ~{WR} (in), 17 VDD (power), 18 VREFB (in), 19 VOUTB (out), 20 AGND B (power)

## DAC8248FP
designator U?
Dual 12-Bit (8-Bit Byte) CMOS Double-Buffered Digital-to-Analog Converter, -40 to +85 degC, N-24-1, Tube; Generic Part Number: DAC8248; Manufacturer: Analog Devices; PartNumber: DAC8248FP; # DAC Outputs: 2; Max V+: 15.75V; Op Pwr Diss: 30mW; Resolution (Bits): 12; Settling Time: 1µs; Single Supply: Yes; DatasheetVersion: Rev.B; PackageVersion: 071006-A; PackageReference: N-24-1; PackageDescription: 24-Lead Plastic Dual In-Line Package [PDIP] Narrow Body; Supplier 1: Digi-Key; Supplier Part Number 1: DAC8248FP-ND; Supplier 2: Mouser; Supplier Part Number 2: 584-DAC8248FP; Packing: Tube; RoHS: N; Mounting Technology: Through Hole; Code_JEDEC: MS-001; ComponentLink1Description: Manufacturer URL; ComponentLink1URL: http://www.analog.com/en/index.html; ComponentLink2Description: Datasheet; ComponentLink2URL: http://www.analog.com/static/imported-files/data_sheets/DAC8248.pdf; ComponentLink3Description: Package Specification; ComponentLink3URL: http://www.analog.com/static/imported-files/packages/50726455539629N_24_1.pdf; ComponentLink4Description: Product URL; ComponentLink4URL: http://www.analog.com/en/digital-to-analog-converters/da-converters/dac8248/products/product.html
footprint N-24-1 (DIP, 24-Leads, Row Spacing 7.62mm, Pitch 2.54mm, Body 31.9x6.6mm)
pins: 1 AGND (power), 2 IOUTA (out), 3 RFB A (in), 4 VREF A (in), 5 DGND (power), 6 DB7 (MSB) (in), 7 DB6 (in), 8 DB5 (in), 9 DB4 (in), 10 DB3 (in), 11 DB2 (in), 12 NC, 13 NC, 14 DB1 (in), 15 DB0 (LSB) (in), 16 ~{RESET} (in), 17 ~{LSB}/MSB (in), 18 ~{DAC A}/DAC B (in), 19 ~{LDAC} (in), 20 ~{WR} (in), 21 VDD (power), 22 VREF B (in), 23 RFB B (in), 24 IOUT B (out)

## DAC8248FPZ
designator U?
Dual 12-Bit (8-Bit Byte) CMOS Double-Buffered Digital-to-Analog Converter, -40 to +85 degC, N-24-1, Pb-Free, Tube; Generic Part Number: DAC8248; Manufacturer: Analog Devices; PartNumber: DAC8248FPZ; # DAC Outputs: 2; Max V+: 15.75V; Op Pwr Diss: 30mW; Resolution (Bits): 12; Settling Time: 1µs; Single Supply: Yes; DatasheetVersion: Rev.B; PackageVersion: 071006-A; PackageReference: N-24-1; PackageDescription: 24-Lead Plastic Dual In-Line Package [PDIP] Narrow Body; Supplier 1: Digi-Key; Supplier Part Number 1: DAC8248FPZ-ND; Supplier 2: Farnell; Supplier Part Number 2: 1581906; Supplier 3: Newark; Supplier Part Number 3: 15P1429; Supplier 4: Mouser; Supplier Part Number 4: 584-DAC8248FPZ; Packing: Tube; RoHS: Y; Mounting Technology: Through Hole; Code_JEDEC: MS-001; ComponentLink1Description: Manufacturer URL; ComponentLink1URL: http://www.analog.com/en/index.html; ComponentLink2Description: Datasheet; ComponentLink2URL: http://www.analog.com/static/imported-files/data_sheets/DAC8248.pdf; ComponentLink3Description: Package Specification; ComponentLink3URL: http://www.analog.com/static/imported-files/packages/50726455539629N_24_1.pdf; ComponentLink4Description: Product URL; ComponentLink4URL: http://www.analog.com/en/digital-to-analog-converters/da-converters/dac8248/products/product.html
footprint N-24-1 (DIP, 24-Leads, Row Spacing 7.62mm, Pitch 2.54mm, Body 31.9x6.6mm)
pins: 1 AGND (power), 2 IOUTA (out), 3 RFB A (in), 4 VREF A (in), 5 DGND (power), 6 DB7 (MSB) (in), 7 DB6 (in), 8 DB5 (in), 9 DB4 (in), 10 DB3 (in), 11 DB2 (in), 12 NC, 13 NC, 14 DB1 (in), 15 DB0 (LSB) (in), 16 ~{RESET} (in), 17 ~{LSB}/MSB (in), 18 ~{DAC A}/DAC B (in), 19 ~{LDAC} (in), 20 ~{WR} (in), 21 VDD (power), 22 VREF B (in), 23 RFB B (in), 24 IOUT B (out)

## DAC8248FS
designator U?
Dual 12-Bit (8-Bit Byte) CMOS Double-Buffered Digital-to-Analog Converter, RW-24, Tube; Generic Part Number: DAC8248; Manufacturer: Analog Devices; PartNumber: DAC8248FS; # DAC Outputs: 2; Max V+: 15.75V; Op Pwr Diss: 30mW; Resolution (Bits): 12; Settling Time: 1µs; Single Supply: Yes; DatasheetVersion: Rev.B; PackageVersion: 060706-A; PackageReference: RW-24; PackageDescription: 24-Lead Standard Small Outline Package [SOIC_W]; Supplier 1: Digi-Key; Supplier Part Number 1: DAC8248FS-ND; Supplier 2: Mouser; Supplier Part Number 2: 584-DAC8248FS; Packing: Tube; RoHS: N; Mounting Technology: Surface Mount; Code_JEDEC: MS-013-AD; ComponentLink1Description: Manufacturer URL; ComponentLink1URL: http://www.analog.com/en/index.html; ComponentLink2Description: Datasheet; ComponentLink2URL: http://www.analog.com/static/imported-files/data_sheets/DAC8248.pdf; ComponentLink3Description: Package Specification; ComponentLink3URL: http://www.analog.com/static/imported-files/packages/33665150946139RW_24.pdf; ComponentLink4Description: Product URL; ComponentLink4URL: http://www.analog.com/en/digital-to-analog-converters/da-converters/dac8248/products/product.html
footprint RW-24_N (SOIC, 24-Leads, Body 15.4x7.5mm, Pitch 1.27mm, IPC Medium Density)
footprint RW-24_L (SOIC, 24-Leads, Body 15.4x7.5mm, Pitch 1.27mm, IPC High Density)
footprint RW-24_M (SOIC, 24-Leads, Body 15.4x7.5mm, Pitch 1.27mm, IPC Low Density)
pins: 1 AGND (power), 2 IOUT A (out), 3 RFB A (in), 4 VREF A (in), 5 DGND (power), 6 DB7 (MSB) (in), 7 DB6 (in), 8 DB5 (in), 9 DB4 (in), 10 DB3 (in), 11 DB2 (in), 12 NC, 13 NC, 14 DB1 (in), 15 DB0 (LSB) (in), 16 ~{RESET} (in), 17 ~{LSB}/MSB (in), 18 ~{DAC A}/DAC B (in), 19 ~{LDAC} (in), 20 ~{WR} (in), 21 VDD (power), 22 VREF B (in), 23 RFB B (in), 24 IOUT B (out)

## DAC8248FSZ
designator U?
Dual 12-Bit (8-Bit Byte) CMOS Double-Buffered Digital-to-Analog Converter, RW-24, Pb-Free, Tube; Generic Part Number: DAC8248; Manufacturer: Analog Devices; PartNumber: DAC8248FSZ; # DAC Outputs: 2; Max V+: 15.75V; Op Pwr Diss: 30mW; Resolution (Bits): 12; Settling Time: 1µs; Single Supply: Yes; DatasheetVersion: Rev.B; PackageVersion: 060706-A; PackageReference: RW-24; PackageDescription: 24-Lead Standard Small Outline Package [SOIC_W]; Supplier 1: Digi-Key; Supplier Part Number 1: DAC8248FSZ-ND; Supplier 2: Mouser; Supplier Part Number 2: 584-DAC8248FSZ; Packing: Tube; RoHS: Y; Mounting Technology: Surface Mount; Code_JEDEC: MS-013-AD; ComponentLink1Description: Manufacturer URL; ComponentLink1URL: http://www.analog.com/en/index.html; ComponentLink2Description: Datasheet; ComponentLink2URL: http://www.analog.com/static/imported-files/data_sheets/DAC8248.pdf; ComponentLink3Description: Package Specification; ComponentLink3URL: http://www.analog.com/static/imported-files/packages/33665150946139RW_24.pdf; ComponentLink4Description: Product URL; ComponentLink4URL: http://www.analog.com/en/digital-to-analog-converters/da-converters/dac8248/products/product.html
footprint RW-24_N (SOIC, 24-Leads, Body 15.4x7.5mm, Pitch 1.27mm, IPC Medium Density)
footprint RW-24_L (SOIC, 24-Leads, Body 15.4x7.5mm, Pitch 1.27mm, IPC High Density)
footprint RW-24_M (SOIC, 24-Leads, Body 15.4x7.5mm, Pitch 1.27mm, IPC Low Density)
pins: 1 AGND (power), 2 IOUT A (out), 3 RFB A (in), 4 VREF A (in), 5 DGND (power), 6 DB7 (MSB) (in), 7 DB6 (in), 8 DB5 (in), 9 DB4 (in), 10 DB3 (in), 11 DB2 (in), 12 NC, 13 NC, 14 DB1 (in), 15 DB0 (LSB) (in), 16 ~{RESET} (in), 17 ~{LSB}/MSB (in), 18 ~{DAC A}/DAC B (in), 19 ~{LDAC} (in), 20 ~{WR} (in), 21 VDD (power), 22 VREF B (in), 23 RFB B (in), 24 IOUT B (out)

## DAC8248FSZ-REEL
designator U?
Dual 12-Bit (8-Bit Byte) CMOS Double-Buffered Digital-to-Analog Converter, RW-24, Pb-Free, Reel; Generic Part Number: DAC8248; Manufacturer: Analog Devices; PartNumber: DAC8248FSZ-REEL; # DAC Outputs: 2; Max V+: 15.75V; Op Pwr Diss: 30mW; Resolution (Bits): 12; Settling Time: 1µs; Single Supply: Yes; DatasheetVersion: Rev.B; PackageVersion: 060706-A; PackageReference: RW-24; PackageDescription: 24-Lead Standard Small Outline Package [SOIC_W]; Supplier 1: Digi-Key; Supplier Part Number 1: DAC8248FSZ-REEL-ND; Supplier 2: Mouser; Supplier Part Number 2: 584-DAC8248FSZ-R; Packing: Reel; RoHS: Y; Mounting Technology: Surface Mount; Code_JEDEC: MS-013-AD; ComponentLink1Description: Manufacturer URL; ComponentLink1URL: http://www.analog.com/en/index.html; ComponentLink2Description: Datasheet; ComponentLink2URL: http://www.analog.com/static/imported-files/data_sheets/DAC8248.pdf; ComponentLink3Description: Package Specification; ComponentLink3URL: http://www.analog.com/static/imported-files/packages/33665150946139RW_24.pdf; ComponentLink4Description: Product URL; ComponentLink4URL: http://www.analog.com/en/digital-to-analog-converters/da-converters/dac8248/products/product.html
footprint RW-24_N (SOIC, 24-Leads, Body 15.4x7.5mm, Pitch 1.27mm, IPC Medium Density)
footprint RW-24_L (SOIC, 24-Leads, Body 15.4x7.5mm, Pitch 1.27mm, IPC High Density)
footprint RW-24_M (SOIC, 24-Leads, Body 15.4x7.5mm, Pitch 1.27mm, IPC Low Density)
pins: 1 AGND (power), 2 IOUT A (out), 3 RFB A (in), 4 VREF A (in), 5 DGND (power), 6 DB7 (MSB) (in), 7 DB6 (in), 8 DB5 (in), 9 DB4 (in), 10 DB3 (in), 11 DB2 (in), 12 NC, 13 NC, 14 DB1 (in), 15 DB0 (LSB) (in), 16 ~{RESET} (in), 17 ~{LSB}/MSB (in), 18 ~{DAC A}/DAC B (in), 19 ~{LDAC} (in), 20 ~{WR} (in), 21 VDD (power), 22 VREF B (in), 23 RFB B (in), 24 IOUT B (out)
